# Altium footprint library LimeMicroAltiumLib.PcbLib: 769 footprints (part 44 of 50)
Each footprint in its own frame and in the unit in brackets; x right, y up, seen from the top. Pads: shape width x height; smd on the part's side, far side on the other; paste and mask are expansions set on the pad; w line width, h text height; cw(c..) or ccw(c..) is an arc to the next point about the centre after c.
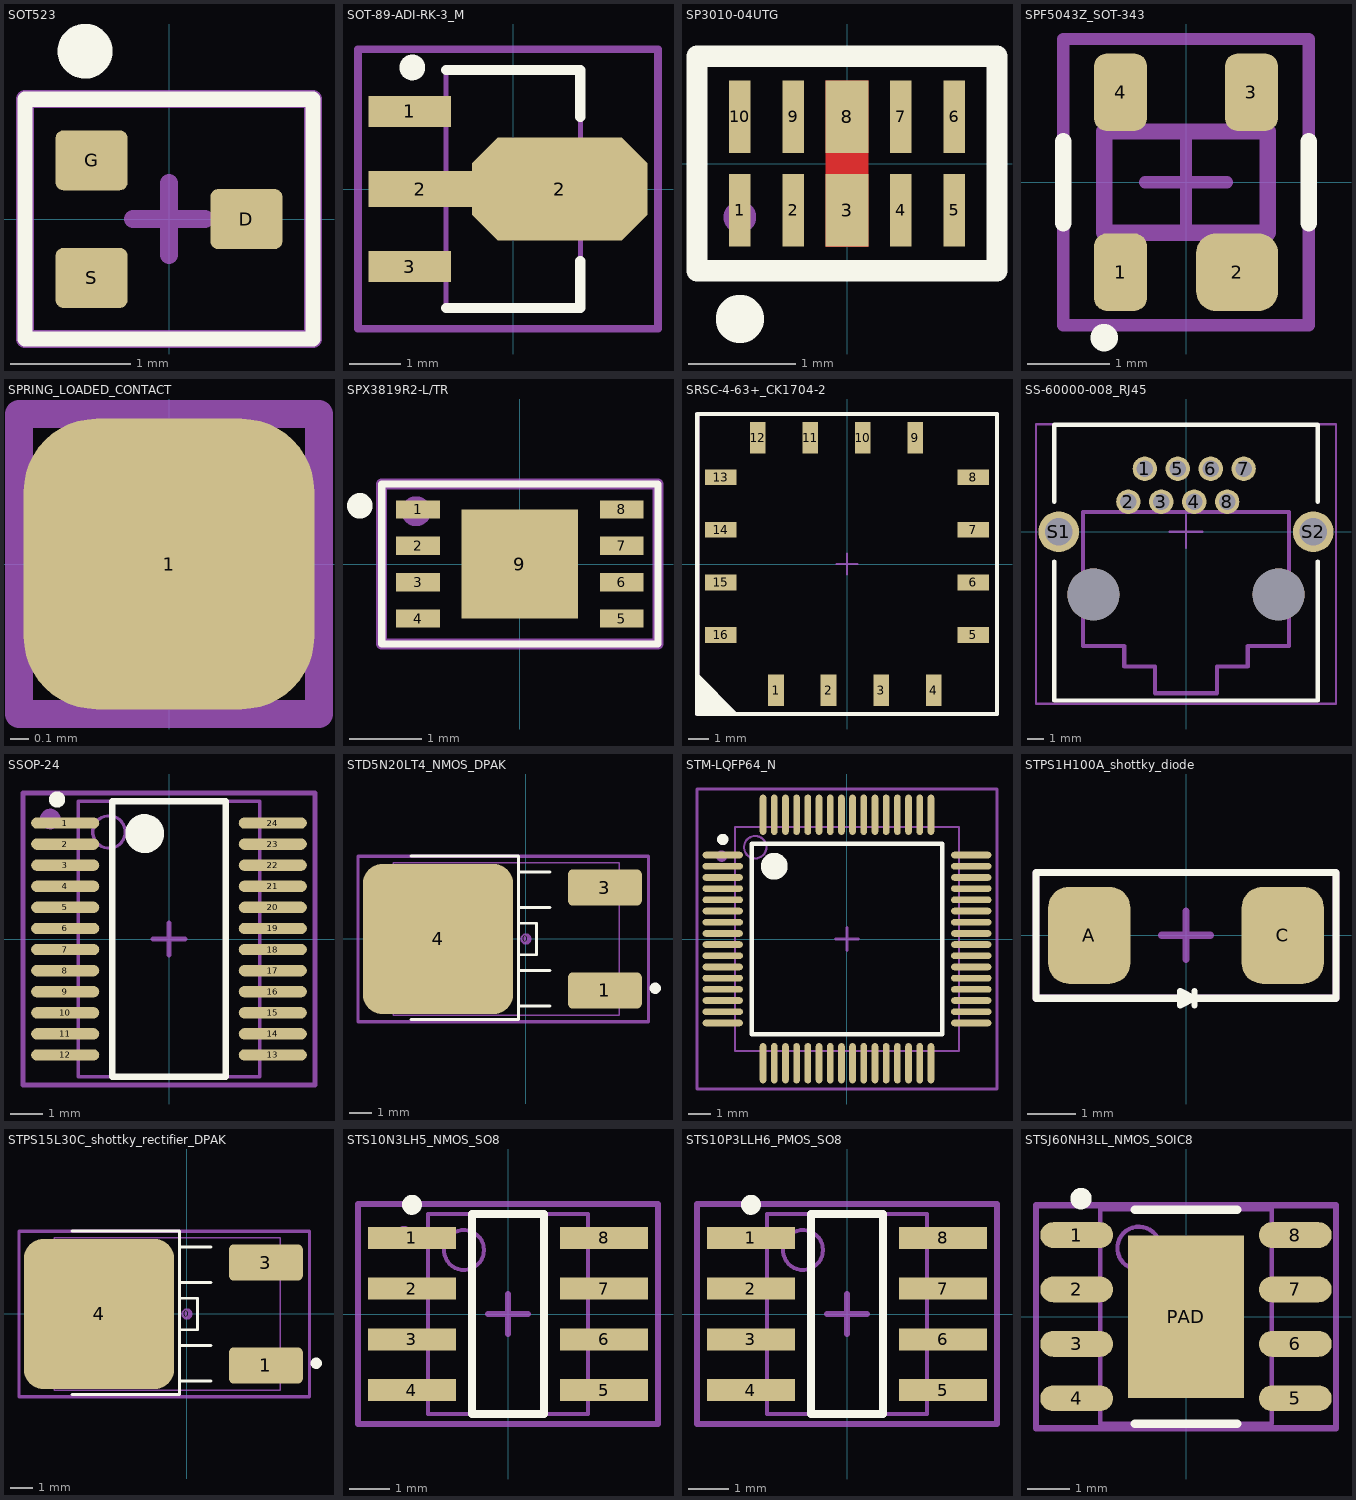
[diagram p43: the footprints below, top view; thin cyan lines are the x and y axes]

## SOT523 [mm]
height 1.003
pads (3):
  rrect25% 0.6x0.5 smd: D(0.645,0) G(-0.645,0.49) S(-0.645,-0.49)
Top Overlay:
  circle w0.254: c-0.7,1.4 r0.102
  lines w0.127: -1.2,-1 -1.2,1 1.2,1 1.2,-1 -1.2,-1
Mechanical 15:
  lines w0.15: -0.3,0 0.3,0 ; 0,-0.3 0,0.3 ; -1.2,-1 -1.2,1 1.2,1 1.2,-1 -1.2,-1
  text ".Designator" at 0,0 h0.55
  text "G" at -0.7,0.4 h0.3
  text "D" at 0.6,-0.1 h0.3
  text "S" at -0.7,-0.6 h0.3
3D body "User Library-SOT-523.step": height 0.8, standoff 0, extent -0.8,-0.8 0.8,0.8

## SOT-89-ADI-RK-3_M [mm] "SOT89, 3-Leads, Body 4.5x2.4 mm, Pitch 1.5mm, Lead Span 4.1mm, IPC Low Density"
height 1.6
pads (4):
  rect 1.6x0.6 smd: 1(-2,1.5) 3(-2,-1.5)
  rect 2x0.7 smd: 2(-1.8,0)
  oct 3.4x2 smd: 2(0.9,0)
Top Overlay:
  circle w0.25: c-1.95,2.35 r0.125
  lines w0.2: -1.3,-2.3 1.3,-2.3 1.3,-1.4 ; -1.3,2.3 1.3,2.3 1.3,1.4
Mechanical 13:
  lines w0.1: -1.3,-2.3 -1.3,2.3 1.3,2.3 1.3,-2.3 -1.3,-2.3
Mechanical 15:
  circle w0.15: c-2.125,1.5 r0.056
  lines w0.15: -0.5,0 0.5,0 ; 0,-0.5 0,0.5 ; -3,-2.7 -3,2.7 2.8,2.7 2.8,-2.7 -3,-2.7
  text ".Designator" at 0,0 h0.55
3D body "SW3dPS-SOT89.STEP": height 1.59, standoff -0.02, extent -2.408,-2.286 1.842,2.314

## SP3010-04UTG [mm]
pads (10):
  rect 0.2x0.675 smd mask+0.05: 1(-1,-0.437) 2(-0.5,-0.437) 4(0.5,-0.437) 5(1,-0.437) 6(1,0.437) 7(0.5,0.437) 9(-0.5,0.437) 10(-1,0.437)
  rect 0.4x0.675 smd mask+0.05: 3(0,-0.437) 8(0,0.437)
Top Layer:
  region: 0.2,0.775 0.2,-0.775 -0.2,-0.775 -0.2,0.775
Top Overlay:
  circle w0.4: c-1,-1.45 r0.025
  lines w0.2: -1.4,-1 1.4,-1 1.4,1 -1.4,1 -1.4,-1
Mechanical 15:
  circle w0.254: c-1,-0.5 r0.025
  lines w0.15: -1.4,-1 1.4,-1 1.4,1 -1.4,1 -1.4,-1
  text ".Designator" at 0,0 h0.55
3D body "uDFN-10.STEP": height 0.52, standoff -0.01, extent -1.25,-0.51 1.25,0.51

## SPF5043Z_SOT-343 [mm]
pads (4):
  rrect50% 0.65x0.95 smd mask+0.05: 1(-0.8,-1.1) 3(0.8,1.1) 4(-0.8,1.1)
  rrect50% 1x0.95 smd mask+0.05: 2(0.625,-1.1)
Top Overlay:
  circle w0.3: c-1,-1.9 r0.017
  lines w0.2: -1.5,-0.5 -1.5,0.5 ; 1.5,-0.5 1.5,0.5
Mechanical 13:
  lines w0.2: -1,-0.62 -1,0.62 1,0.62 1,-0.62 -1,-0.62
Mechanical 15:
  circle w0.2: c-0.675,-1.175 r0.09
  lines w0.15: -0.5,0 0,0 ; 0,-0.5 0,0 ; 0,0.5 0,0 ; 0.5,0 0,0 ; -1.5,-1.75 -1.5,1.75 1.5,1.75 1.5,-1.75 -1.5,-1.75
  text ".Designator" at 0,0 h0.55
3D body "User Library-SOT343-1.step": height 1, standoff 0, extent -1.1,-1.1 1.1,1.1

## SPRING_LOADED_CONTACT [mm]
pads (1):
  rrect50% 1.55x1.55 smd mask+0.05: 1(0,0)
Mechanical 15:
  lines w0.15: -0.425,0 0,0 ; 0,-0.425 0,0 ; 0,0.425 0,0 ; 0.425,0 0,0 ; -0.8,-0.8 -0.8,0.8 0.8,0.8 0.8,-0.8 -0.8,-0.8
  text ".Designator" at 0,0 h0.55
3D body: height 2, standoff 0, extent -0.6,-0.6 0.6,0.6
3D body: height 4, standoff 2, extent -0.3,-0.3 0.3,0.3

## SPX3819R2-L/TR [mm]
pads (9):
  rect 0.6x0.25 smd mask+0.05: 1(-1.4,0.75) 2(-1.4,0.25) 3(-1.4,-0.25) 4(-1.4,-0.75) 5(1.4,-0.75) 6(1.4,-0.25) 7(1.4,0.25) 8(1.4,0.75)
  rect 1.6x1.5 smd: 9(0,0)
Top Overlay:
  circle w0.3: c-2.2,0.8 r0.025
  lines w0.1: -1.9,-1.1 -1.9,1.1 1.9,1.1 1.9,-1.1 -1.9,-1.1
Mechanical 15:
  circle w0.3: c-1.425,0.725 r0.056
  lines w0.15: -0.25,0 0,0 ; 0,-0.25 0,0 ; 0,0.25 0,0 ; 0.25,0 0,0 ; -1.9,-1.1 1.9,-1.1 1.9,1.1 -1.9,1.1 -1.9,-1.1
  text ".Designator" at 0,0 h0.55
3D body "User Library-DFN-8 DCB.step": height 0.75, standoff 0, extent -1.51,-1 1.51,1

## SRSC-4-63+_CK1704-2 [mm]
pads (16):
  rect 0.76x1.52 smd: 1(-3.43,-6.1) 2(-0.89,-6.1) 3(1.65,-6.1) 4(4.19,-6.1) 9(3.3,6.1) 10(0.76,6.1) 11(-1.78,6.1) 12(-4.32,6.1)
  rect 1.52x0.76 smd: 5(6.1,-3.43) 6(6.1,-0.89) 7(6.1,1.65) 8(6.1,4.19) 13(-6.1,4.19) 14(-6.1,1.65) 15(-6.1,-0.89) 16(-6.1,-3.43)
Top Overlay:
  region: -5.25,-7.25 -7.25,-5.25 -7.25,-7.25
  lines w0.2: -7.24,-7.25 -7.24,7.25 7.25,7.25 7.25,-7.25 -7.24,-7.25
Mechanical 15:
  circle w0.254: c-3.5,-6 r0.056
  lines w0.1: -0.5,0 0,0 ; 0,-0.5 0,0 ; 0,0.5 0,0 ; 0.5,0 0,0
  lines w0.2: -7.24,-7.25 7.25,-7.25 7.25,7.25 -7.24,7.25 -7.24,-7.25
  text ".Designator" at 0,0 h0.55
3D body "User Library-ROS-425-319 in CK605 case detailed.STEP": height 4.57, standoff 0, extent -6.35,-6.35 6.35,6.35

## SS-60000-008_RJ45 [mm]
pads (12):
  round 1.5 hole 1: 1(-2.54,3.873) 2(-3.556,1.841) 3(-1.524,1.841) 4(0.508,1.841) 5(-0.508,3.873) 6(1.524,3.873) 7(3.556,3.873) 8(2.54,1.841)
  round 2.515 hole 1.7: S1(-7.849,-0.013) S2(7.849,-0.013)
  round 3.2 hole 3.2 unplated: ""(-5.715,-3.873) ""(5.715,-3.873)
Top Overlay:
  lines w0.254: -8.128,-1.841 -8.128,-10.427 8.128,-10.427 8.128,-1.841 ; -8.128,1.841 -8.128,6.591 8.128,6.591 8.128,1.841
Mechanical 13:
  lines w0.254: -6.35,-7.048 -6.35,1.206 6.35,1.206 6.35,-7.048 3.81,-7.048 3.81,-8.319 1.905,-8.319 1.905,-9.97 -1.905,-9.97 -1.905,-8.319 -3.81,-8.319 -3.81,-7.048 -6.35,-7.048
Mechanical 15:
  lines w0.15: -1,0 0,0 ; 0,-1 0,0 ; 0,1 0,0 ; 1,0 0,0 ; -9.25,-10.623 -9.25,6.626 9.25,6.626 9.25,-10.623 -9.25,-10.623
  text ".Designator" at 0,0 h0.55
3D body "SS-60000-008.stp": height 16.62, standoff -3.96, extent -8.001,-10.365 8.001,6.374

## SSOP-24 [mm] "SOP, 24-Leads, Body 8,5x5,6mm (max), Pitch 0,65mm, IPC Medium Density"
height 2
pads (24):
  oval 2.1x0.35 smd: 1(-3.2,3.575) 2(-3.2,2.925) 3(-3.2,2.275) 4(-3.2,1.625) 5(-3.2,0.975) 6(-3.2,0.325) 7(-3.2,-0.325) 8(-3.2,-0.975) 9(-3.2,-1.625) 10(-3.2,-2.275) 11(-3.2,-2.925) 12(-3.2,-3.575) 13(3.2,-3.575) 14(3.2,-2.925) 15(3.2,-2.275) 16(3.2,-1.625) 17(3.2,-0.975) 18(3.2,-0.325) 19(3.2,0.325) 20(3.2,0.975) 21(3.2,1.625) 22(3.2,2.275) 23(3.2,2.925) 24(3.2,3.575)
Top Overlay:
  circle w0.25: c-3.45,4.3 r0.125
  circle w0.6: c-0.75,3.25 r0.3
  lines w0.2: -1.75,-4.25 -1.75,4.25 1.75,4.25 1.75,-4.25 -1.75,-4.25
Mechanical 13:
  circle w0.1: c-1.85,3.3 r0.5
  lines w0.1: -2.8,-4.25 -2.8,4.25 2.8,4.25 2.8,-4.25 -2.8,-4.25
Mechanical 15:
  circle w0.35: c-3.659,3.7 r0.141
  lines w0.15: -0.5,0 0.5,0 ; 0,-0.5 0,0.5 ; -4.5,-4.5 -4.5,4.5 4.5,4.5 4.5,-4.5 -4.5,-4.5
  text ".designator" at 0,0 h0.55
3D body "SOP65P640X110-24N.STEP": height 1.2, standoff 0, extent -3.25,-3.95 3.25,3.95

## STD5N20LT4_NMOS_DPAK [mm] "D-PAK/TO-263-3; 3 Leads (1 Cropped); Body 14.7 (inc. leads) x 10.2 mm (LxW max)"
height 4.572
pads (4):
  round 0.508 on Mech15: 0(0,0)
  rrect25% 3.3x1.6 smd: 1(3.526,-2.3) 3(3.526,2.3)
  rrect25% 6.7x6.7 smd: 4(-3.926,0)
Top Overlay:
  circle w0.25: c5.774,-2.2 r0.125
  lines w0.127: -5.126,-3.6 -0.326,-3.6 -0.326,3.7 -5.126,3.7 ; 1.074,-3 -0.326,-3 -0.326,-1.4 1.074,-1.4 ; 1.074,1.4 -0.326,1.4 -0.326,3 1.074,3 ; -0.326,-0.7 0.474,-0.7 0.474,0.7 -0.326,0.7 -0.326,-0.7
Mechanical 13:
  lines w0.076: -5.928,-3.4 -5.928,3.4 4.174,3.4 4.174,-3.4 -5.928,-3.4
Mechanical 15:
  circle w0.3: c3.674,-2.2 r0.1
  lines w0.15: -7.5,-3.7 5.474,-3.7 5.474,3.7 -7.5,3.7 -7.5,-3.7
  text ".Designator" at 0,0 h0.55
3D body "User Library-DPAK_TO-252AA.step": height 2.37, standoff -0.03, extent -5.928,-3.367 4.172,3.367

## STM-LQFP64_N [mm] "Thin QFP, 64-Leads, Body 10x10mm, Pitch 0.5mm, IPC Medium Density"
height 1.6
pads (64):
  oval 1.8x0.3 smd mask+0.05: 1(-5.55,3.75) 2(-5.55,3.25) 3(-5.55,2.75) 4(-5.55,2.25) 5(-5.55,1.75) 6(-5.55,1.25) 7(-5.55,0.75) 8(-5.55,0.25) 9(-5.55,-0.25) 10(-5.55,-0.75) 11(-5.55,-1.25) 12(-5.55,-1.75) 13(-5.55,-2.25) 14(-5.55,-2.75) 15(-5.55,-3.25) 16(-5.55,-3.75) 33(5.55,-3.75) 34(5.55,-3.25) 35(5.55,-2.75) 36(5.55,-2.25) 37(5.55,-1.75) 38(5.55,-1.25) 39(5.55,-0.75) 40(5.55,-0.25) 41(5.55,0.25) 42(5.55,0.75) 43(5.55,1.25) 44(5.55,1.75) 45(5.55,2.25) 46(5.55,2.75) 47(5.55,3.25) 48(5.55,3.75)
  oval 0.3x1.8 smd mask+0.05: 17(-3.75,-5.55) 18(-3.25,-5.55) 19(-2.75,-5.55) 20(-2.25,-5.55) 21(-1.75,-5.55) 22(-1.25,-5.55) 23(-0.75,-5.55) 24(-0.25,-5.55) 25(0.25,-5.55) 26(0.75,-5.55) 27(1.25,-5.55) 28(1.75,-5.55) 29(2.25,-5.55) 30(2.75,-5.55) 31(3.25,-5.55) 32(3.75,-5.55) 49(3.75,5.55) 50(3.25,5.55) 51(2.75,5.55) 52(2.25,5.55) 53(1.75,5.55) 54(1.25,5.55) 55(0.75,5.55) 56(0.25,5.55) 57(-0.25,5.55) 58(-0.75,5.55) 59(-1.25,5.55) 60(-1.75,5.55) 61(-2.25,5.55) 62(-2.75,5.55) 63(-3.25,5.55) 64(-3.75,5.55)
Top Overlay:
  circle w0.6: c-3.25,3.25 r0.3
  circle w0.25: c-5.55,4.45 r0.125
  lines w0.2: -4.25,-4.25 4.25,-4.25 4.25,4.25 -4.25,4.25 -4.25,-4.25
Mechanical 13:
  circle w0.1: c-4.1,4.1 r0.5
  lines w0.1: -5,-5 5,-5 5,5 -5,5 -5,-5
Mechanical 15:
  circle w0.25: c-5.6,3.7 r0.125
  lines w0.15: -0.5,0 0.5,0 ; 0,-0.5 0,0.5 ; -6.7,-6.7 6.7,-6.7 6.7,6.7 -6.7,6.7 -6.7,-6.7
  text ".Designator" at 0,0 h0.55
3D body "LQFP-64.STEP": height 1.6, standoff 0, extent -6,-6 6,6

## STPS1H100A_shottky_diode [mm]
pads (2):
  rrect50% 1.7x2 smd mask+0.05: A(-2,0) C(2,0)
Top Overlay:
  lines w0.127: -0.125,-1.3 0.175,-1.3 ; 0.175,-1.45 0.175,-1.15 ; 0.175,-1.3 -0.125,-1.45 -0.125,-1.15 0.175,-1.3
  lines w0.15: -3.1,-1.3 3.1,-1.3 3.1,1.3 -3.1,1.3 -3.1,-1.3
Mechanical 15:
  lines w0.15: -0.5,0 0,0 ; 0,-0.5 0,0 ; 0,0.5 0,0 ; 0.5,0 0,0 ; -3.1,-1.3 3.1,-1.3 3.1,1.3 -3.1,1.3 -3.1,-1.3
  text ".Designator" at -0.2,-0.2 h0.55
  text "C" at 1.7,-0.4 h0.55
  text "A" at -2.4,-0.5 h0.55
3D body "User Library-Diode Molded Body.step": height 2.89, standoff -0.03, extent -2.65,-1.3 2.65,1.3

## STPS15L30C_shottky_rectifier_DPAK [mm] "D-PAK/TO-263-3; 3 Leads (1 Cropped); Body 14.7 (inc. leads) x 10.2 mm (LxW max)"
height 4.572
pads (4):
  round 0.508 on Mech15: 0(0,0)
  rrect25% 3.3x1.6 smd: 1(3.526,-2.3) 3(3.526,2.3)
  rrect25% 6.7x6.7 smd: 4(-3.926,0)
Top Overlay:
  circle w0.25: c5.774,-2.2 r0.125
  lines w0.127: -5.126,-3.6 -0.326,-3.6 -0.326,3.7 -5.126,3.7 ; 1.074,-3 -0.326,-3 -0.326,-1.4 1.074,-1.4 ; 1.074,1.4 -0.326,1.4 -0.326,3 1.074,3 ; -0.326,-0.7 -0.326,0.7 0.474,0.7 0.474,-0.7 -0.326,-0.7
Mechanical 13:
  lines w0.076: -5.928,-3.4 4.174,-3.4 4.174,3.4 -5.928,3.4 -5.928,-3.4
Mechanical 15:
  circle w0.3: c3.674,-2.2 r0.1
  lines w0.15: -7.5,-3.7 -7.5,3.7 5.474,3.7 5.474,-3.7 -7.5,-3.7
  text ".Designator" at 0,0 h0.55
3D body "User Library-DPAK_TO-252AA.step": height 2.37, standoff -0.03, extent -5.928,-3.367 4.172,3.367

## STS10N3LH5_NMOS_SO8 [mm] "SOIC, 8-Leads, Body 4,90x3,90mm, Pitch 1,27mm, IPC Medium Density"
height 1.7
pads (8):
  rect 2.2x0.55 smd: 1(-2.4,1.905) 2(-2.4,0.635) 3(-2.4,-0.635) 4(-2.4,-1.905) 5(2.4,-1.905) 6(2.4,-0.635) 7(2.4,0.635) 8(2.4,1.905)
Top Overlay:
  circle w0.25: c-2.4,2.73 r0.125
  lines w0.2: -0.9,-2.5 -0.9,2.5 0.9,2.5 0.9,-2.5 -0.9,-2.5
Mechanical 13:
  circle w0.1: c-1.1,1.6 r0.5
  lines w0.1: -2,-2.5 -2,2.5 2,2.5 2,-2.5 -2,-2.5
Mechanical 15:
  circle w0.2: c-2.6,2 r0.1
  lines w0.15: -0.5,0 0.5,0 ; 0,-0.5 0,0.5 ; -3.75,-2.75 -3.75,2.75 3.75,2.75 3.75,-2.75 -3.75,-2.75
  text ".Designator" at 0,0 h0.55
3D body "CircuitWorks-SO-8.step": height 1.45, standoff 0, extent -2.889,-2.45 2.889,2.452

## STS10P3LLH6_PMOS_SO8 [mm] "SOIC, 8-Leads, Body 4,90x3,90mm, Pitch 1,27mm, IPC Medium Density"
height 1.7
pads (8):
  rect 2.2x0.55 smd: 1(-2.4,1.905) 2(-2.4,0.635) 3(-2.4,-0.635) 4(-2.4,-1.905) 5(2.4,-1.905) 6(2.4,-0.635) 7(2.4,0.635) 8(2.4,1.905)
Top Overlay:
  circle w0.25: c-2.4,2.73 r0.125
  lines w0.2: -0.9,-2.5 -0.9,2.5 0.9,2.5 0.9,-2.5 -0.9,-2.5
Mechanical 13:
  circle w0.1: c-1.1,1.6 r0.5
  lines w0.1: -2,-2.5 -2,2.5 2,2.5 2,-2.5 -2,-2.5
Mechanical 15:
  circle w0.2: c-2.5,1.9 r0.1
  lines w0.15: -0.5,0 0.5,0 ; 0,-0.5 0,0.5 ; -3.75,-2.75 -3.75,2.75 3.75,2.75 3.75,-2.75 -3.75,-2.75
  text ".Designator" at 0,0 h0.55
3D body "CircuitWorks-SO-8.step": height 1.45, standoff 0, extent -2.889,-2.45 2.889,2.452

## STSJ60NH3LL_NMOS_SOIC8 [mm] "8-Pin Small Outline Integrated Circuit 1.27 mm Pitch"
height 1.55
pads (9):
  oval 1.7x0.6 smd mask+0.05: 1(-2.55,1.905) 2(-2.55,0.635) 3(-2.55,-0.635) 4(-2.55,-1.905) 5(2.55,-1.905) 6(2.55,-0.635) 7(2.55,0.635) 8(2.55,1.905)
  rect 2.7x3.8 smd mask+0.05: PAD(0,0)
Top Overlay:
  circle w0.25: c-2.45,2.755 r0.125
  lines w0.2: -1.2,-2.5 1.2,-2.5 ; -1.2,2.5 1.2,2.5
Mechanical 13:
  circle w0.1: c-1.1,1.6 r0.5
  lines w0.1: -2,-2.5 2,-2.5 2,2.5 -2,2.5 -2,-2.5
Mechanical 15:
  circle w0.35: c-2.6,1.9 r0.1
  lines w0.15: -0.5,0 0.5,0 ; 0,-0.5 0,0.5 ; -3.5,-2.6 3.5,-2.6 3.5,2.6 -3.5,2.6 -3.5,-2.6
  text ".Designator" at 0,0 h0.55
3D body "SOIC-8.STEP": height 1.75, standoff 0, extent -3,-2.45 3,2.45